# Altium footprint library 接口库PCB.PcbLib: 76 footprints (part 1 of 5)
Each footprint in its own frame and in the unit in brackets; x right, y up, seen from the top. Pads: shape width x height; smd on the part's side, far side on the other; paste and mask are expansions set on the pad; w line width, h text height; cw(c..) or ccw(c..) is an arc to the next point about the centre after c.
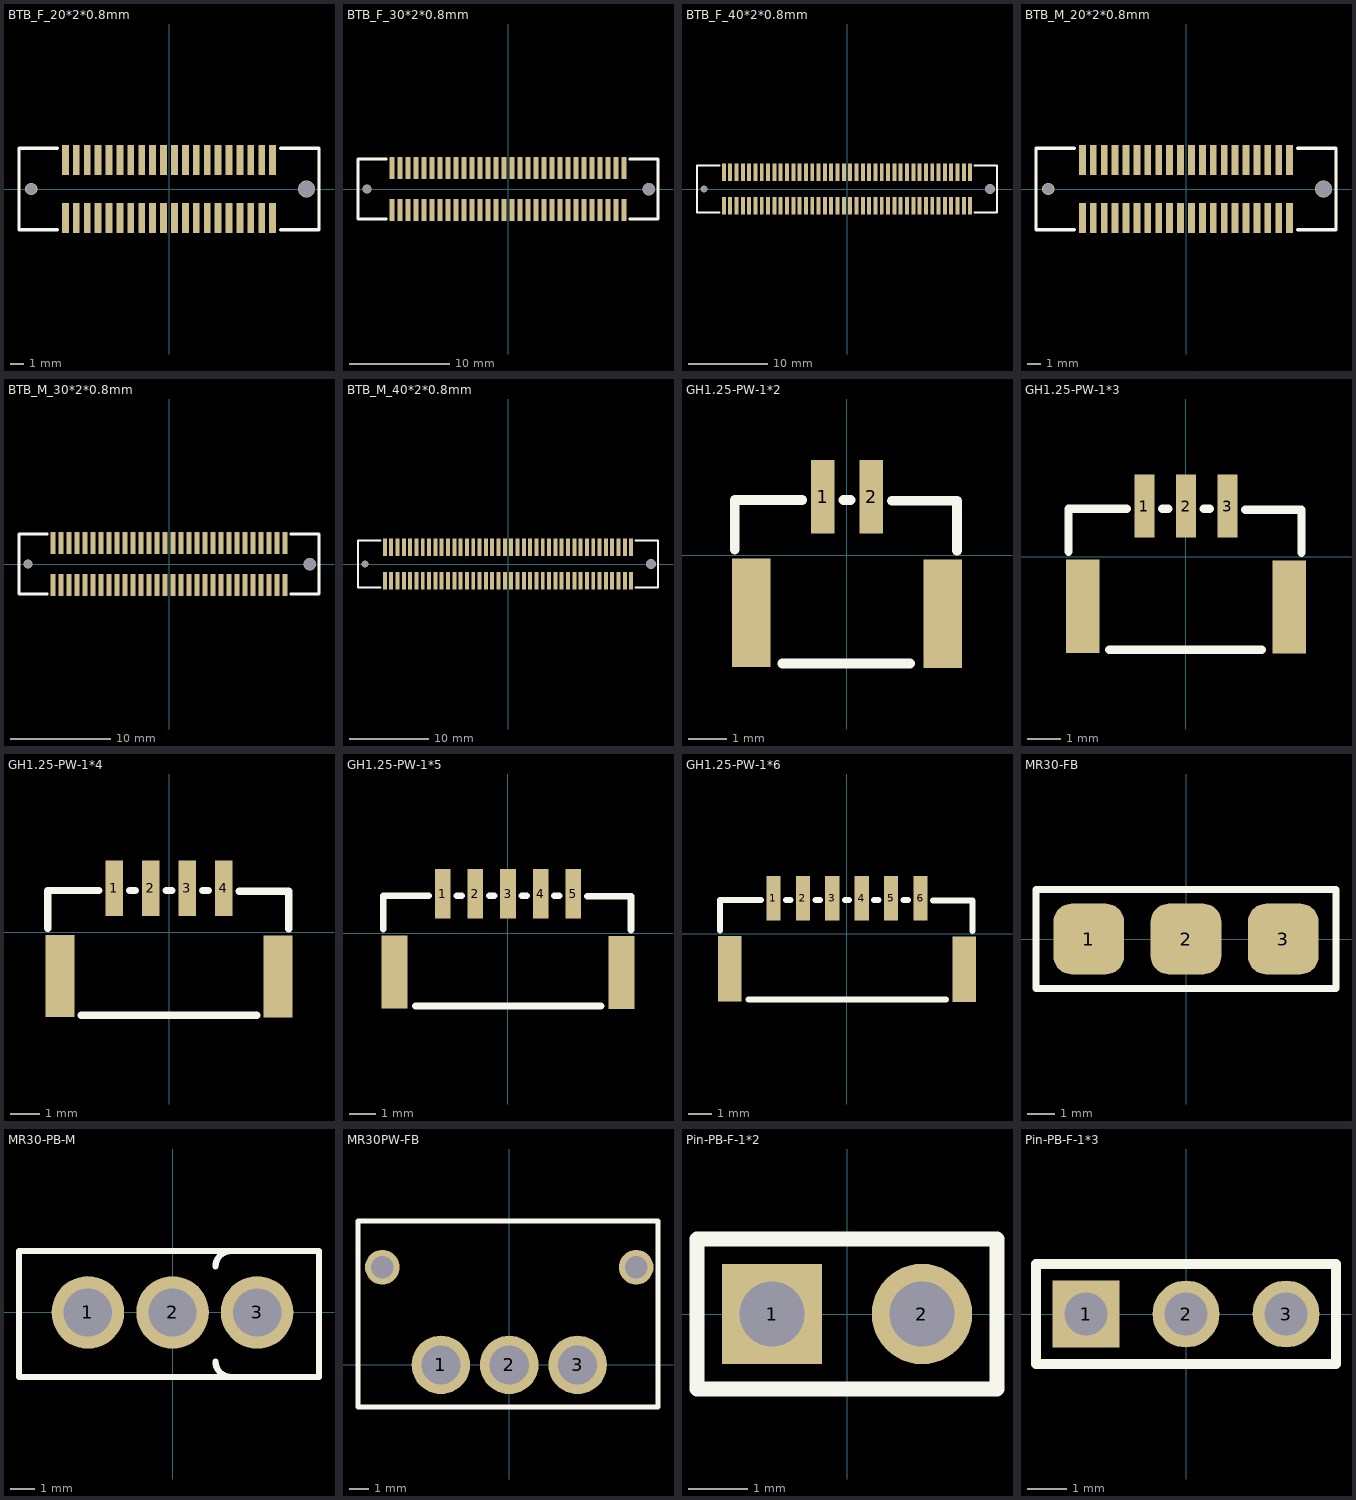
[diagram p0: the footprints below, top view; thin cyan lines are the x and y axes]

## BTB_F_20*2*0.8mm [mm]
pads (40):
  rect 0.5x2.2 smd: 1(-7.6,2.12) 2(-6.8,2.12) 3(-6,2.12) 4(-5.2,2.12) 5(-4.4,2.12) 6(-3.6,2.12) 7(-2.8,2.12) 8(-2,2.12) 9(-1.2,2.12) 10(-0.4,2.12) 11(0.4,2.12) 12(1.2,2.12) 13(2,2.12) 14(2.8,2.12) 15(3.6,2.12) 16(4.4,2.12) 17(5.2,2.12) 18(6,2.12) 19(6.8,2.12) 20(7.6,2.12) 21(7.6,-2.12) 22(6.8,-2.12) 23(6,-2.12) 24(5.2,-2.12) 25(4.4,-2.12) 26(3.6,-2.12) 27(2.8,-2.12) 28(2,-2.12) 29(1.2,-2.12) 30(0.4,-2.12) 31(-0.4,-2.12) 32(-1.2,-2.12) 33(-2,-2.12) 34(-2.8,-2.12) 35(-3.6,-2.12) 36(-4.4,-2.12) 37(-5.2,-2.12) 38(-6,-2.12) 39(-6.8,-2.12) 40(-7.6,-2.12)
via 10.1,0 diameter 1.25 hole 1.2
via -10.1,0 diameter 0.9 hole 0.8
Top Overlay:
  lines w0.254: -8.176,-3 -11,-3 -11,3 -8.176,3 ; 8.176,-3 11,-3 11,3 8.176,3
3D body "BTB-40P-F.step": height 3.75, standoff -1.38, extent -10.9,-3.222 10.9,3.175

## BTB_F_30*2*0.8mm [mm]
pads (60):
  rect 0.5x2.2 smd: 1(-11.6,2.12) 2(-10.8,2.12) 3(-10,2.12) 4(-9.2,2.12) 5(-8.4,2.12) 6(-7.6,2.12) 7(-6.8,2.12) 8(-6,2.12) 9(-5.2,2.12) 10(-4.4,2.12) 11(-3.6,2.12) 12(-2.8,2.12) 13(-2,2.12) 14(-1.2,2.12) 15(-0.4,2.12) 16(0.4,2.12) 17(1.2,2.12) 18(2,2.12) 19(2.8,2.12) 20(3.6,2.12) 21(4.4,2.12) 22(5.2,2.12) 23(6,2.12) 24(6.8,2.12) 25(7.6,2.12) 26(8.4,2.12) 27(9.2,2.12) 28(10,2.12) 29(10.8,2.12) 30(11.6,2.12) 31(11.6,-2.12) 32(10.8,-2.12) 33(10,-2.12) 34(9.2,-2.12) 35(8.4,-2.12) 36(7.6,-2.12) 37(6.8,-2.12) 38(6,-2.12) 39(5.2,-2.12) 40(4.4,-2.12) 41(3.6,-2.12) 42(2.8,-2.12) 43(2,-2.12) 44(1.2,-2.12) 45(0.4,-2.12) 46(-0.4,-2.12) 47(-1.2,-2.12) 48(-2,-2.12) 49(-2.8,-2.12) 50(-3.6,-2.12) 51(-4.4,-2.12) 52(-5.2,-2.12) 53(-6,-2.12) 54(-6.8,-2.12) 55(-7.6,-2.12) 56(-8.4,-2.12) 57(-9.2,-2.12) 58(-10,-2.12) 59(-10.8,-2.12) 60(-11.6,-2.12)
via -14.1,0 diameter 0.9 hole 0.8
via 14.1,0 diameter 1.25 hole 1.2
Top Overlay:
  lines w0.254: -12.176,-3 -15,-3 -15,3 -12.176,3 ; 12.176,-3 15,-3 15,3 12.176,3
3D body "BTB-60P-F.step": height 4.6, standoff -1.38, extent -14.859,-3.222 14.941,3.175

## BTB_F_40*2*0.8mm [mm]
pads (80):
  rect 0.5x2.2 smd: 1(-15.6,2.12) 2(-14.8,2.12) 3(-14,2.12) 4(-13.2,2.12) 5(-12.4,2.12) 6(-11.6,2.12) 7(-10.8,2.12) 8(-10,2.12) 9(-9.2,2.12) 10(-8.4,2.12) 11(-7.6,2.12) 12(-6.8,2.12) 13(-6,2.12) 14(-5.2,2.12) 15(-4.4,2.12) 16(-3.6,2.12) 17(-2.8,2.12) 18(-2,2.12) 19(-1.2,2.12) 20(-0.4,2.12) 21(0.4,2.12) 22(1.2,2.12) 23(2,2.12) 24(2.8,2.12) 25(3.6,2.12) 26(4.4,2.12) 27(5.2,2.12) 28(6,2.12) 29(6.8,2.12) 30(7.6,2.12) 31(8.4,2.12) 32(9.2,2.12) 33(10,2.12) 34(10.8,2.12) 35(11.6,2.12) 36(12.4,2.12) 37(13.2,2.12) 38(14,2.12) 39(14.8,2.12) 40(15.6,2.12) 41(15.6,-2.12) 42(14.8,-2.12) 43(14,-2.12) 44(13.2,-2.12) 45(12.4,-2.12) 46(11.6,-2.12) 47(10.8,-2.12) 48(10,-2.12) 49(9.2,-2.12) 50(8.4,-2.12) 51(7.6,-2.12) 52(6.8,-2.12) 53(6,-2.12) 54(5.2,-2.12) 55(4.4,-2.12) 56(3.6,-2.12) 57(2.8,-2.12) 58(2,-2.12) 59(1.2,-2.12) 60(0.4,-2.12) 61(-0.4,-2.12) 62(-1.2,-2.12) 63(-2,-2.12) 64(-2.8,-2.12) 65(-3.6,-2.12) 66(-4.4,-2.12) 67(-5.2,-2.12) 68(-6,-2.12) 69(-6.8,-2.12) 70(-7.6,-2.12) 71(-8.4,-2.12) 72(-9.2,-2.12) 73(-10,-2.12) 74(-10.8,-2.12) 75(-11.6,-2.12) 76(-12.4,-2.12) 77(-13.2,-2.12) 78(-14,-2.12) 79(-14.8,-2.12) 80(-15.6,-2.12)
via 18.1,0 diameter 1.25 hole 1.2
via -18.1,0 diameter 0.9 hole 0.8
Top Overlay:
  lines w0.254: -16.176,-3 -19,-3 -19,3 -16.176,3 ; 16.176,-3 19,-3 19,3 16.176,3
3D body "BTB-80P-F.step": height 4.6, standoff -1.38, extent -18.9,-3.222 18.9,3.175

## BTB_M_20*2*0.8mm [mm]
pads (40):
  rect 0.5x2.2 smd: 1(-7.6,2.12) 2(-6.8,2.12) 3(-6,2.12) 4(-5.2,2.12) 5(-4.4,2.12) 6(-3.6,2.12) 7(-2.8,2.12) 8(-2,2.12) 9(-1.2,2.12) 10(-0.4,2.12) 11(0.4,2.12) 12(1.2,2.12) 13(2,2.12) 14(2.8,2.12) 15(3.6,2.12) 16(4.4,2.12) 17(5.2,2.12) 18(6,2.12) 19(6.8,2.12) 20(7.6,2.12) 21(7.6,-2.12) 22(6.8,-2.12) 23(6,-2.12) 24(5.2,-2.12) 25(4.4,-2.12) 26(3.6,-2.12) 27(2.8,-2.12) 28(2,-2.12) 29(1.2,-2.12) 30(0.4,-2.12) 31(-0.4,-2.12) 32(-1.2,-2.12) 33(-2,-2.12) 34(-2.8,-2.12) 35(-3.6,-2.12) 36(-4.4,-2.12) 37(-5.2,-2.12) 38(-6,-2.12) 39(-6.8,-2.12) 40(-7.6,-2.12)
via -10.1,0 diameter 0.9 hole 0.8
via 10.1,0 diameter 1.25 hole 1.2
Top Overlay:
  lines w0.254: -8.176,-3 -11,-3 -11,3 -8.176,3 ; 8.176,-3 11,-3 11,3 8.176,3
3D body "BTB-40P-M.step": height 4.6, standoff -1.38, extent -10.9,-3.222 10.9,3.175

## BTB_M_30*2*0.8mm [mm]
pads (60):
  rect 0.5x2.2 smd: 1(-11.6,2.12) 2(-10.8,2.12) 3(-10,2.12) 4(-9.2,2.12) 5(-8.4,2.12) 6(-7.6,2.12) 7(-6.8,2.12) 8(-6,2.12) 9(-5.2,2.12) 10(-4.4,2.12) 11(-3.6,2.12) 12(-2.8,2.12) 13(-2,2.12) 14(-1.2,2.12) 15(-0.4,2.12) 16(0.4,2.12) 17(1.2,2.12) 18(2,2.12) 19(2.8,2.12) 20(3.6,2.12) 21(4.4,2.12) 22(5.2,2.12) 23(6,2.12) 24(6.8,2.12) 25(7.6,2.12) 26(8.4,2.12) 27(9.2,2.12) 28(10,2.12) 29(10.8,2.12) 30(11.6,2.12) 31(11.6,-2.12) 32(10.8,-2.12) 33(10,-2.12) 34(9.2,-2.12) 35(8.4,-2.12) 36(7.6,-2.12) 37(6.8,-2.12) 38(6,-2.12) 39(5.2,-2.12) 40(4.4,-2.12) 41(3.6,-2.12) 42(2.8,-2.12) 43(2,-2.12) 44(1.2,-2.12) 45(0.4,-2.12) 46(-0.4,-2.12) 47(-1.2,-2.12) 48(-2,-2.12) 49(-2.8,-2.12) 50(-3.6,-2.12) 51(-4.4,-2.12) 52(-5.2,-2.12) 53(-6,-2.12) 54(-6.8,-2.12) 55(-7.6,-2.12) 56(-8.4,-2.12) 57(-9.2,-2.12) 58(-10,-2.12) 59(-10.8,-2.12) 60(-11.6,-2.12)
via -14.1,0 diameter 0.9 hole 0.8
via 14.1,0 diameter 1.25 hole 1.2
Top Overlay:
  lines w0.254: -12.176,-3 -15,-3 -15,3 -12.176,3 ; 12.176,-3 15,-3 15,3 12.176,3
3D body "BTB-60P-F.step": height 4.6, standoff -1.38, extent -14.9,-3.222 14.9,3.175

## BTB_M_40*2*0.8mm [mm]
pads (80):
  rect 0.5x2.2 smd: 1(-15.6,2.12) 2(-14.8,2.12) 3(-14,2.12) 4(-13.2,2.12) 5(-12.4,2.12) 6(-11.6,2.12) 7(-10.8,2.12) 8(-10,2.12) 9(-9.2,2.12) 10(-8.4,2.12) 11(-7.6,2.12) 12(-6.8,2.12) 13(-6,2.12) 14(-5.2,2.12) 15(-4.4,2.12) 16(-3.6,2.12) 17(-2.8,2.12) 18(-2,2.12) 19(-1.2,2.12) 20(-0.4,2.12) 21(0.4,2.12) 22(1.2,2.12) 23(2,2.12) 24(2.8,2.12) 25(3.6,2.12) 26(4.4,2.12) 27(5.2,2.12) 28(6,2.12) 29(6.8,2.12) 30(7.6,2.12) 31(8.4,2.12) 32(9.2,2.12) 33(10,2.12) 34(10.8,2.12) 35(11.6,2.12) 36(12.4,2.12) 37(13.2,2.12) 38(14,2.12) 39(14.8,2.12) 40(15.6,2.12) 41(15.6,-2.12) 42(14.8,-2.12) 43(14,-2.12) 44(13.2,-2.12) 45(12.4,-2.12) 46(11.6,-2.12) 47(10.8,-2.12) 48(10,-2.12) 49(9.2,-2.12) 50(8.4,-2.12) 51(7.6,-2.12) 52(6.8,-2.12) 53(6,-2.12) 54(5.2,-2.12) 55(4.4,-2.12) 56(3.6,-2.12) 57(2.8,-2.12) 58(2,-2.12) 59(1.2,-2.12) 60(0.4,-2.12) 61(-0.4,-2.12) 62(-1.2,-2.12) 63(-2,-2.12) 64(-2.8,-2.12) 65(-3.6,-2.12) 66(-4.4,-2.12) 67(-5.2,-2.12) 68(-6,-2.12) 69(-6.8,-2.12) 70(-7.6,-2.12) 71(-8.4,-2.12) 72(-9.2,-2.12) 73(-10,-2.12) 74(-10.8,-2.12) 75(-11.6,-2.12) 76(-12.4,-2.12) 77(-13.2,-2.12) 78(-14,-2.12) 79(-14.8,-2.12) 80(-15.6,-2.12)
via 18.1,0 diameter 1.25 hole 1.2
via -18.1,0 diameter 0.9 hole 0.8
Top Overlay:
  lines w0.254: -16.176,-3 -19,-3 -19,3 -16.176,3 ; 16.176,-3 19,-3 19,3 16.176,3
3D body "BTB-80P-F.step": height 4.6, standoff -1.38, extent -18.9,-3.175 18.9,3.222

## GH1.25-PW-1*2 [mm]
pads (4):
  rect 0.6x1.9 smd: 1(-0.625,1.513) 2(0.625,1.513)
  rect 1x2.8 smd: ""(-2.475,-1.488) ""(2.475,-1.513)
Top Overlay:
  lines w0.254: -2.9,0.144 -2.9,1.432 -1.156,1.432 ; -1.671,-2.794 1.631,-2.794 ; -0.094,1.432 0.094,1.432 ; 1.156,1.407 2.84,1.407 2.84,0.119
3D body "User Library-GH-2-90.step": height 4.14, standoff -0.02, extent -2.88,-2.887 2.88,1.665

## GH1.25-PW-1*3 [mm]
pads (5):
  rect 0.6x1.9 smd: 1(-1.25,1.513) 2(0,1.513) 3(1.25,1.513)
  rect 1x2.8 smd: ""(-3.1,-1.488) ""(3.1,-1.513)
Top Overlay:
  lines w0.254: -3.525,0.144 -3.525,1.432 -1.781,1.432 ; -2.296,-2.794 2.276,-2.794 ; -0.719,1.432 -0.531,1.432 ; 0.531,1.432 0.719,1.432 ; 1.781,1.407 3.465,1.407 3.465,0.119
3D body "User Library-GH-3-90.step": height 4.14, standoff -0.02, extent -3.5,-2.887 3.5,1.718

## GH1.25-PW-1*4 [mm]
pads (6):
  rect 0.6x1.9 smd: 1(-1.875,1.513) 2(-0.625,1.513) 3(0.625,1.513) 4(1.875,1.513)
  rect 1x2.8 smd: ""(-3.725,-1.488) ""(3.725,-1.513)
Top Overlay:
  lines w0.254: -4.15,0.144 -4.15,1.432 -2.406,1.432 ; -2.994,-2.838 3,-2.838 ; -1.344,1.432 -1.156,1.432 ; -0.094,1.432 0.094,1.432 ; 1.156,1.432 1.344,1.432 ; 2.406,1.407 4.09,1.407 4.09,0.119
3D body "User Library-GH-4-90.step": height 4.14, standoff -0.02, extent -4.13,-2.887 4.13,1.665

## GH1.25-PW-1*5 [mm]
pads (7):
  rect 0.6x1.9 smd: 1(-2.5,1.513) 2(-1.25,1.513) 3(0,1.513) 4(1.25,1.513) 5(2.5,1.513)
  rect 1x2.8 smd: ""(-4.35,-1.488) ""(4.35,-1.513)
Top Overlay:
  lines w0.254: -4.775,0.144 -4.775,1.432 -3.031,1.432 ; -3.546,-2.794 3.566,-2.794 ; -1.969,1.432 -1.781,1.432 ; -0.719,1.432 -0.531,1.432 ; 0.531,1.432 0.719,1.432 ; 1.781,1.432 1.969,1.432 ; 3.031,1.407 4.715,1.407 4.715,0.119
3D body "User Library-GH-5-90.step": height 4.14, standoff -0.02, extent -4.75,-2.887 4.75,1.718

## GH1.25-PW-1*6 [mm]
pads (8):
  rect 0.6x1.9 smd: 1(-3.125,1.513) 2(-1.875,1.513) 3(-0.625,1.513) 4(0.625,1.513) 5(1.875,1.513) 6(3.125,1.513)
  rect 1x2.8 smd: ""(-4.975,-1.488) ""(4.975,-1.513)
Top Overlay:
  lines w0.254: -5.4,0.144 -5.4,1.432 -3.656,1.432 ; -4.196,-2.794 4.211,-2.794 ; -2.594,1.432 -2.406,1.432 ; -1.344,1.432 -1.156,1.432 ; -0.094,1.432 0.094,1.432 ; 1.156,1.432 1.344,1.432 ; 2.406,1.432 2.594,1.432 ; 3.656,1.407 5.34,1.407 5.34,0.119
3D body "User Library-GH-6-90.step": height 4.14, standoff -0.02, extent -5.38,-2.887 5.38,1.665

## MR30-FB [mm]
pads (3):
  rrect50% 2.54x2.54 smd: 1(-3.5,0) 2(0,0) 3(3.5,0)
Top Overlay:
  lines w0.254: -5.397,-1.778 5.397,-1.778 5.397,1.778 -5.397,1.778 -5.397,-1.778
3D body "MR30-FB.step": height 2.6, standoff -2.6, extent -6.1,-11.738 6.1,0.762

## MR30-PB-M [mm]
pads (3):
  round 3 hole 2: 1(-3.5,0) 2(0,0) 3(3.5,0)
Top Overlay:
  lines w0.254: 1.778,-2.032 ccw(c2.413,-2.032) 2.413,-2.667 ; 1.778,1.905 cw(c2.413,1.905) 2.413,2.54 ; -6.35,-2.667 -0.214,-2.667 6.056,-2.667 6.056,-0.699 6.056,0.699 6.056,2.54 -0.087,2.54 -6.35,2.54 -6.35,-2.667
3D body "MR30-M.step": height 10.46, standoff -3.04, extent -6.177,-2.667 5.923,2.433

## MR30PW-FB [mm]
pads (5):
  round 3 hole 2: 1(-3.5,0) 2(0,0) 3(3.5,0)
  round 1.778 hole 1.143: ""(-6.5,5) ""(6.5,5)
Top Overlay:
  lines w0.254: -7.747,-2.159 7.62,-2.159 7.62,7.366 -7.747,7.366 -7.747,-2.159
3D body "MR30PW-FB .step": height 5.3, standoff -1.65, extent -7.7,-0.703 7.7,13.747

## Pin-PB-F-1*2 [mm]
pads (2):
  rect 1.7x1.7 hole 1.1: 1(-1.27,0)
  round 1.7 hole 1.1: 2(1.27,0)
Top Overlay:
  lines w0.254: -2.54,-1.27 -2.54,1.27 2.54,1.27 2.54,-1.27 -2.54,-1.27
3D body "2PM.step": height 8.54, standoff -3, extent -2.54,-1.27 2.54,1.27

## Pin-PB-F-1*3 [mm]
pads (3):
  rect 1.7x1.7 hole 1.1: 1(-2.54,0)
  round 1.7 hole 1.1: 2(0,0) 3(2.54,0)
Top Overlay:
  lines w0.254: -3.81,-1.27 -3.81,1.27 3.81,1.27 3.81,-1.27 -3.81,-1.27
3D body "3P.step": height 8.54, standoff -3, extent -3.81,-1.27 3.81,1.27